# Altium footprint library PCB_CONNECTORS.PcbLib: 676 footprints (part 26 of 43)
Each footprint in its own frame and in the unit in brackets; x right, y up, seen from the top. Pads: shape width x height; smd on the part's side, far side on the other; paste and mask are expansions set on the pad; w line width, h text height; cw(c..) or ccw(c..) is an arc to the next point about the centre after c.
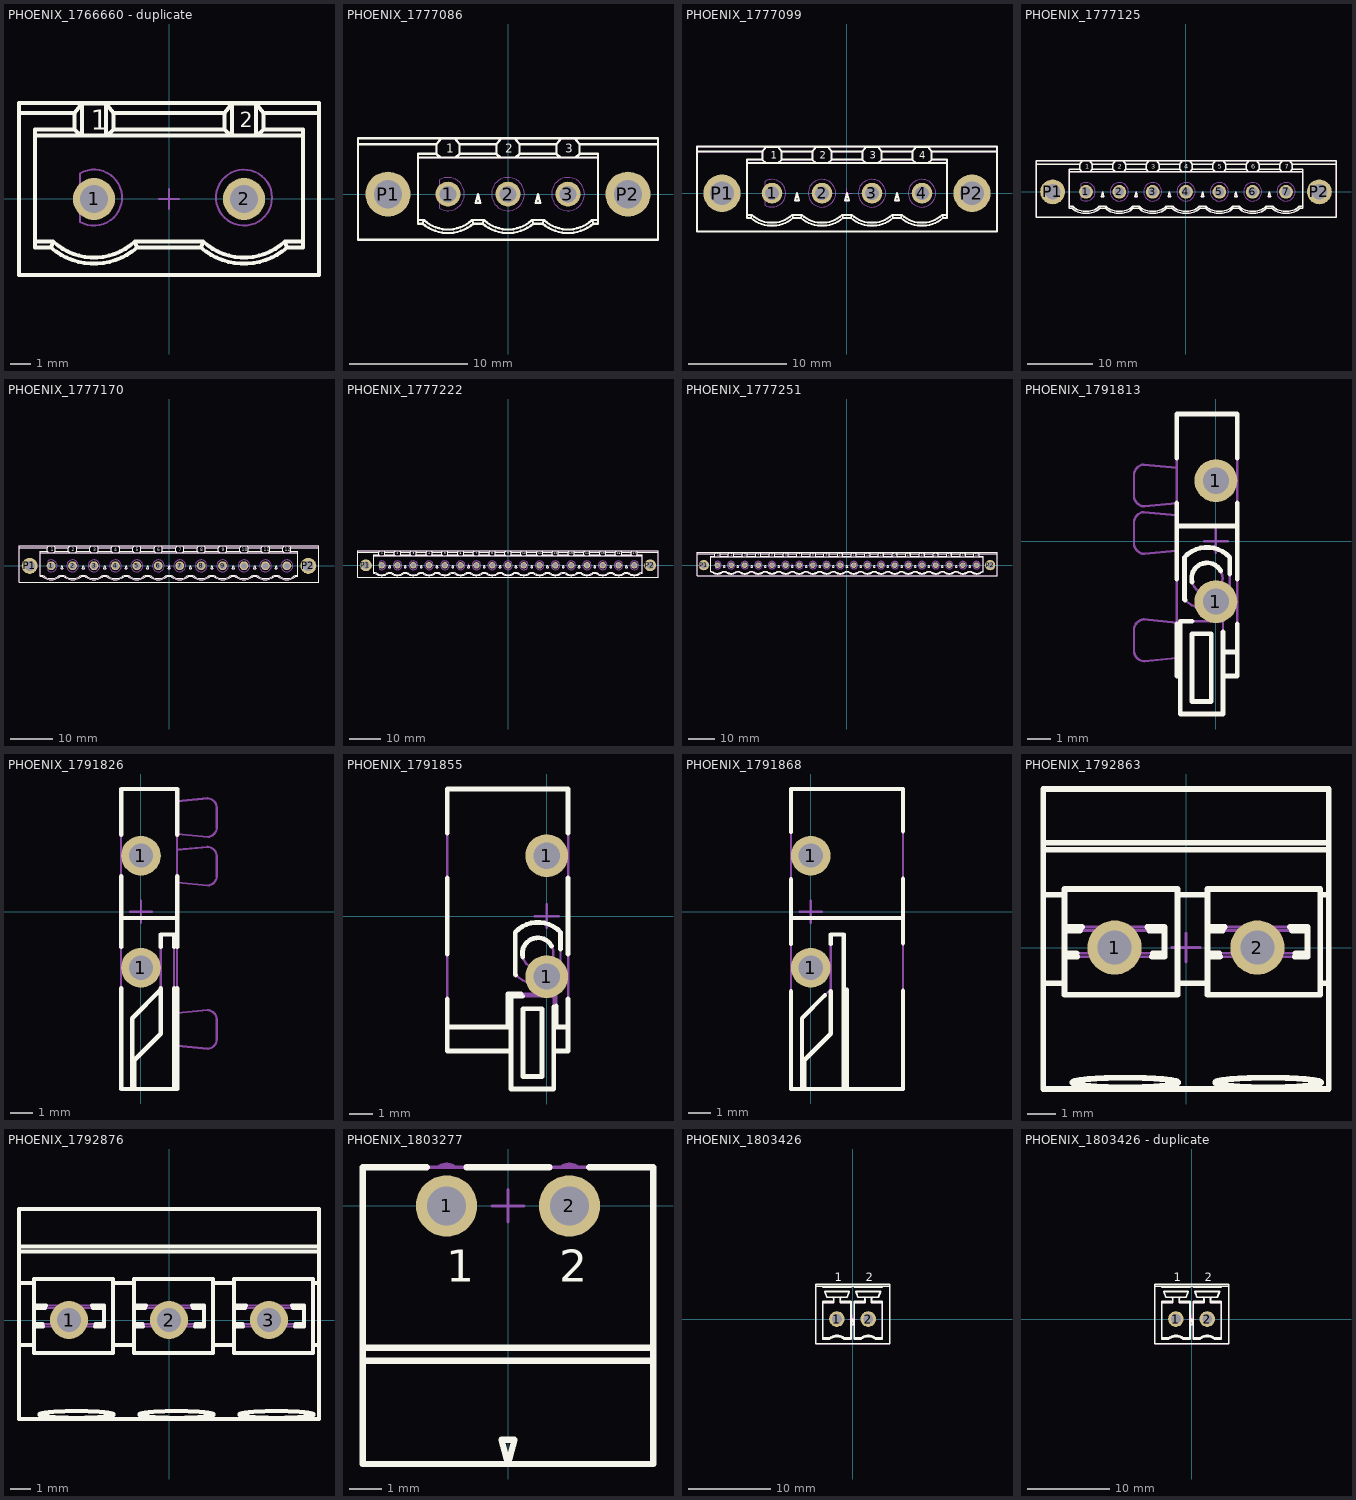
[diagram p25: the footprints below, top view; thin cyan lines are the x and y axes]

## PHOENIX_1766660 - duplicate [mm] "PCB Header, 12A 400 V, Pitch: 7.5mm, 2 Positions, GMSTBVA Serie"
height 12
pads (2):
  round 2.1 hole 1.4: 1(-3.75,0) 2(3.75,0)
Top Overlay:
  lines w0.2: -7.5,4.3 -4.725,4.3 ; -6.7,-2.13 -5.79,-2.13 ; -6.7,3.163 6.7,3.163 ; -4.394,3.163 -4.725,3.475 ; -4.355,3.163 -4.355,4.773 ; -3.145,3.163 -3.145,4.773 ; -3.106,3.163 -2.775,3.475 ; 3.106,3.163 2.775,3.475 ; 3.145,3.163 3.145,4.773 ; 4.355,3.163 4.355,4.773 ; 4.394,3.163 4.725,3.475 ; 6.7,-2.13 5.79,-2.13 ; 7.5,4.3 4.725,4.3 ; -5.904,-2.43 ccw(c-3.75,0.07) -1.596,-2.43 ; -5.904,-2.43 -6.7,-2.43 -6.7,3.475 -4.725,3.475 ; -5.904,-2.43 -5.79,-2.13 ; -5.79,-2.13 ccw(c-3.75,0.07) -1.71,-2.13 ; -4.725,3.475 -4.725,4.3 ; -4.725,4.3 -4.355,4.773 ; -4.355,4.773 -3.145,4.773 ; -3.145,4.773 -2.775,4.3 ; -2.775,3.475 -2.775,4.3 ; -2.775,3.475 2.775,3.475 ; -2.775,4.3 2.775,4.3 ; -1.71,-2.13 -1.596,-2.43 ; -1.71,-2.13 1.71,-2.13 ; -1.596,-2.43 1.596,-2.43 ; 1.596,-2.43 ccw(c3.75,0.07) 5.904,-2.43 ; 1.596,-2.43 1.71,-2.13 ; 1.71,-2.13 ccw(c3.75,0.07) 5.79,-2.13 ; 2.775,3.475 2.775,4.3 ; 2.775,4.3 3.145,4.773 ; 3.145,4.773 4.355,4.773 ; 4.355,4.773 4.725,4.3 ; 4.725,3.475 6.7,3.475 6.7,-2.43 5.904,-2.43 ; 4.725,3.475 4.725,4.3 ; 5.79,-2.13 5.904,-2.43 ; -7.5,-3.8 7.5,-3.8 7.5,4.8 -7.5,4.8 -7.5,-3.8
  text "2" at 3.53,3.575 h0.75
  text "1" at -3.91,3.46 h1
Mechanical 8:
  lines w0.1: -4.25,0 -3.75,0 ; -3.75,-0.5 -3.75,0 ; -3.75,0.5 -3.75,0 ; -3.25,0 -3.75,0 ; -0.5,0 0,0 ; 0,-0.5 0,0 ; 0,0.5 0,0 ; 0.5,0 0,0 ; 3.25,0 3.75,0 ; 3.75,-0.5 3.75,0 ; 3.75,0.5 3.75,0 ; 4.25,0 3.75,0
Mechanical 14:
  circle w0.1: c3.75,0.07 r1.4
  lines w0.1: -7.5,4.3 -4.725,4.3 ; -6.7,-2.13 -5.79,-2.13 ; -6.7,3.163 6.7,3.163 ; -4.394,3.163 -4.725,3.475 ; -4.355,3.163 -4.355,4.773 ; -3.145,3.163 -3.145,4.773 ; -3.106,3.163 -2.775,3.475 ; 3.106,3.163 2.775,3.475 ; 3.145,3.163 3.145,4.773 ; 4.355,3.163 4.355,4.773 ; 4.394,3.163 4.725,3.475 ; 6.7,-2.13 5.79,-2.13 ; 7.5,4.3 4.725,4.3 ; -5.904,-2.43 ccw(c-3.75,0.07) -1.596,-2.43 ; -5.904,-2.43 -6.7,-2.43 -6.7,3.475 -4.725,3.475 ; -5.904,-2.43 -5.79,-2.13 ; -5.79,-2.13 ccw(c-3.75,0.07) -1.71,-2.13 ; -4.725,3.475 -4.725,4.3 ; -4.725,4.3 -4.355,4.773 ; -4.355,4.773 -3.145,4.773 ; -3.145,4.773 -2.775,4.3 ; -2.775,3.475 -2.775,4.3 ; -2.775,3.475 2.775,3.475 ; -2.775,4.3 2.775,4.3 ; -1.71,-2.13 -1.596,-2.43 ; -1.71,-2.13 1.71,-2.13 ; -1.596,-2.43 1.596,-2.43 ; 1.596,-2.43 ccw(c3.75,0.07) 5.904,-2.43 ; 1.596,-2.43 1.71,-2.13 ; 1.71,-2.13 ccw(c3.75,0.07) 5.79,-2.13 ; 2.775,3.475 2.775,4.3 ; 2.775,4.3 3.145,4.773 ; 3.145,4.773 4.355,4.773 ; 4.355,4.773 4.725,4.3 ; 4.725,3.475 6.7,3.475 6.7,-2.43 5.904,-2.43 ; 4.725,3.475 4.725,4.3 ; 5.79,-2.13 5.904,-2.43 ; -7.5,-3.8 7.5,-3.8 7.5,4.8 -7.5,4.8 -7.5,-3.8 ; -4.45,-1.142 ccw(c-3.75,0.07) -4.45,1.282 -4.45,-1.142
  text "2" at 3.53,3.575 h0.75
  text "1" at -3.91,3.46 h1
3D body "PHOENIX_1766660.stp": height 12, standoff -3.9, extent -7.5,-3.8 7.5,4.8

## PHOENIX_1777086 [mm] "PCB Header, 12A, 320V, Pitch: 5.08mm, 3 Positions, MSTBV Serie"
height 12
pads (5):
  round 2.1 hole 1.4: 1(-5.08,0) 2(0,0) 3(5.08,0)
  round 3.8 hole 2.4: P1(-10.16,0) P2(10.16,0)
Top Overlay:
  lines w0.2: -12.7,4.23 -6.055,4.23 ; -7.62,-2.2 -7.12,-2.2 ; -7.62,3.093 7.62,3.093 ; -5.724,3.093 -6.055,3.405 ; -4.436,3.093 -4.105,3.405 ; -0.644,3.093 -0.975,3.405 ; 0.644,3.093 0.975,3.405 ; 4.436,3.093 4.105,3.405 ; 5.724,3.093 6.055,3.405 ; 7.62,-2.2 7.12,-2.2 ; 12.7,4.23 6.055,4.23 ; -7.234,-2.5 ccw(c-5.08,0) -2.926,-2.5 ; -7.234,-2.5 -7.12,-2.2 ; -7.234,-2.5 -7.62,-2.5 -7.62,3.405 -6.055,3.405 ; -7.12,-2.2 ccw(c-5.08,0) -3.04,-2.2 ; -6.055,3.405 -6.055,4.23 ; -6.055,4.23 -5.685,4.703 -4.475,4.703 -4.105,4.23 ; -4.105,3.405 -4.105,4.23 ; -4.105,3.405 -0.975,3.405 ; -4.105,4.23 -0.975,4.23 ; -3.04,-2.2 -2.04,-2.2 ; -3.04,-2.2 -2.926,-2.5 ; -2.926,-2.5 -2.154,-2.5 ; -2.154,-2.5 ccw(c0,0) 2.154,-2.5 ; -2.154,-2.5 -2.04,-2.2 ; -2.04,-2.2 ccw(c0,0) 2.04,-2.2 ; -0.975,3.405 -0.975,4.23 ; -0.975,4.23 -0.605,4.703 0.605,4.703 0.975,4.23 ; 0.975,3.405 0.975,4.23 ; 0.975,3.405 4.105,3.405 ; 0.975,4.23 4.105,4.23 ; 2.04,-2.2 3.04,-2.2 ; 2.04,-2.2 2.154,-2.5 ; 2.154,-2.5 2.926,-2.5 ; 2.926,-2.5 ccw(c5.08,0) 7.234,-2.5 ; 2.926,-2.5 3.04,-2.2 ; 3.04,-2.2 ccw(c5.08,0) 7.12,-2.2 ; 4.105,3.405 4.105,4.23 ; 4.105,4.23 4.475,4.703 5.685,4.703 6.055,4.23 ; 6.055,3.405 6.055,4.23 ; 6.055,3.405 7.62,3.405 7.62,-2.5 7.234,-2.5 ; 7.12,-2.2 7.234,-2.5 ; -12.7,-3.87 12.7,-3.87 12.7,4.73 -12.7,4.73 -12.7,-3.87 ; -2.741,-0.75 -2.339,-0.75 -2.54,0 -2.741,-0.75 ; 2.339,-0.75 2.741,-0.75 2.54,0 2.339,-0.75
  text "3" at 4.851,3.505 h0.75
  text "2" at -0.22,3.505 h0.75
  text "1" at -5.22,3.505 h0.75
Mechanical 8:
  lines w0.1: -10.66,0 -10.16,0 ; -10.16,-0.5 -10.16,0 ; -10.16,0.5 -10.16,0 ; -9.66,0 -10.16,0 ; -5.58,0 -5.08,0 ; -5.08,-0.5 -5.08,0 ; -5.08,0.5 -5.08,0 ; -4.58,0 -5.08,0 ; -0.5,0 0,0 ; 0,-0.5 0,0 ; 0,0.5 0,0 ; 0.5,0 0,0 ; 4.58,0 5.08,0 ; 5.08,-0.5 5.08,0 ; 5.08,0.5 5.08,0 ; 5.58,0 5.08,0 ; 9.66,0 10.16,0 ; 10.16,-0.5 10.16,0 ; 10.16,0.5 10.16,0 ; 10.66,0 10.16,0
Mechanical 14:
  circle w0.1: c5.08,0 r1.4
  circle w0.1: c0,0 r1.4
  circle w0.1: c-10.16,0 r1.25
  circle w0.1: c10.16,0 r1.25
  lines w0.1: -12.7,4.23 -6.055,4.23 ; -7.62,-2.2 -7.12,-2.2 ; -7.62,3.093 7.62,3.093 ; -5.724,3.093 -6.055,3.405 ; -4.436,3.093 -4.105,3.405 ; -0.644,3.093 -0.975,3.405 ; 0.644,3.093 0.975,3.405 ; 4.436,3.093 4.105,3.405 ; 5.724,3.093 6.055,3.405 ; 7.62,-2.2 7.12,-2.2 ; 12.7,4.23 6.055,4.23 ; -7.234,-2.5 ccw(c-5.08,0) -2.926,-2.5 ; -7.234,-2.5 -7.12,-2.2 ; -7.234,-2.5 -7.62,-2.5 -7.62,3.405 -6.055,3.405 ; -7.12,-2.2 ccw(c-5.08,0) -3.04,-2.2 ; -6.055,3.405 -6.055,4.23 ; -6.055,4.23 -5.685,4.703 -4.475,4.703 -4.105,4.23 ; -5.58,-0.5 -4.58,-0.5 ; -5.58,-0.5 -5.58,0.5 ; -5.58,-0.5 -5.312,-0.232 ; -5.58,0.5 -4.58,0.5 ; -5.58,0.5 -5.312,0.232 ; -5.312,-0.232 -4.848,-0.232 ; -5.312,-0.232 -5.312,0.232 ; -5.312,0.232 -4.848,0.232 ; -4.848,-0.232 -4.848,0.232 ; -4.848,-0.232 -4.58,-0.5 ; -4.848,0.232 -4.58,0.5 ; -4.58,-0.5 -4.58,0.5 ; -4.105,3.405 -4.105,4.23 ; -4.105,3.405 -0.975,3.405 ; -4.105,4.23 -0.975,4.23 ; -3.04,-2.2 -2.04,-2.2 ; -3.04,-2.2 -2.926,-2.5 ; -2.926,-2.5 -2.154,-2.5 ; -2.154,-2.5 ccw(c0,0) 2.154,-2.5 ; -2.154,-2.5 -2.04,-2.2 ; -2.04,-2.2 ccw(c0,0) 2.04,-2.2 ; -0.975,3.405 -0.975,4.23 ; -0.975,4.23 -0.605,4.703 0.605,4.703 0.975,4.23 ; -0.5,-0.5 -0.5,0.5 ; -0.5,-0.5 0.5,-0.5 ; -0.5,-0.5 -0.232,-0.232 ; -0.5,0.5 0.5,0.5 ; -0.5,0.5 -0.232,0.232 ; -0.232,-0.232 0.232,-0.232 ; -0.232,-0.232 -0.232,0.232 ; -0.232,0.232 0.232,0.232 ; 0.232,-0.232 0.232,0.232 ; 0.232,-0.232 0.5,-0.5 ; 0.232,0.232 0.5,0.5 ; 0.5,-0.5 0.5,0.5 ; 0.975,3.405 0.975,4.23 ; 0.975,3.405 4.105,3.405 ; 0.975,4.23 4.105,4.23 ; 2.04,-2.2 3.04,-2.2 ; 2.04,-2.2 2.154,-2.5 ; 2.154,-2.5 2.926,-2.5 ; 2.926,-2.5 ccw(c5.08,0) 7.234,-2.5 ; 2.926,-2.5 3.04,-2.2 ; 3.04,-2.2 ccw(c5.08,0) 7.12,-2.2 ; 4.105,3.405 4.105,4.23 ; 4.105,4.23 4.475,4.703 5.685,4.703 6.055,4.23 ; 4.58,-0.5 4.58,0.5 ; 4.58,-0.5 5.58,-0.5 ; 4.58,-0.5 4.848,-0.232 ; 4.58,0.5 5.58,0.5 ; 4.58,0.5 4.848,0.232 ; 4.848,-0.232 5.312,-0.232 ; 4.848,-0.232 4.848,0.232 ; 4.848,0.232 5.312,0.232 ; 5.312,-0.232 5.312,0.232 ; 5.312,-0.232 5.58,-0.5 ; 5.312,0.232 5.58,0.5 ; 5.58,-0.5 5.58,0.5 ; 6.055,3.405 6.055,4.23 ; 6.055,3.405 7.62,3.405 7.62,-2.5 7.234,-2.5 ; 7.12,-2.2 7.234,-2.5 ; -12.7,-3.87 12.7,-3.87 12.7,4.73 -12.7,4.73 -12.7,-3.87 ; -5.78,-1.212 ccw(c-5.08,0) -5.78,1.212 -5.78,-1.212 ; -2.741,-0.75 -2.339,-0.75 -2.54,0 -2.741,-0.75 ; 2.339,-0.75 2.741,-0.75 2.54,0 2.339,-0.75
  text "1" at -5.22,3.505 h0.75
  text "2" at -0.22,3.505 h0.75
  text "3" at 4.851,3.505 h0.75
3D body "PHOENIX_1777086.stp": height 12, standoff -3.9, extent -12.7,-3.8 12.7,4.8

## PHOENIX_1777099 [mm] "PCB Header, 12A, 320V, Pitch: 5.08mm, 4 Positions, MSTBV Serie"
height 12
pads (6):
  round 2.1 hole 1.4: 1(-7.62,0) 2(-2.54,0) 3(2.54,0) 4(7.62,0)
  round 3.8 hole 2.4: P1(-12.7,0) P2(12.7,0)
Top Overlay:
  lines w0.2: -15.24,4.23 -8.595,4.23 ; -10.16,-2.2 -9.66,-2.2 ; -10.16,3.093 10.16,3.093 ; -8.264,3.093 -8.595,3.405 ; -6.976,3.093 -6.645,3.405 ; -3.184,3.093 -3.515,3.405 ; -1.896,3.093 -1.565,3.405 ; 1.896,3.093 1.565,3.405 ; 3.184,3.093 3.515,3.405 ; 6.976,3.093 6.645,3.405 ; 8.264,3.093 8.595,3.405 ; 10.16,-2.2 9.66,-2.2 ; 15.24,4.23 8.595,4.23 ; -9.774,-2.5 ccw(c-7.62,0) -5.466,-2.5 ; -9.774,-2.5 -10.16,-2.5 -10.16,3.405 -8.595,3.405 ; -9.774,-2.5 -9.66,-2.2 ; -9.66,-2.2 ccw(c-7.62,0) -5.58,-2.2 ; -8.595,3.405 -8.595,4.23 ; -8.595,4.23 -8.225,4.703 -7.015,4.703 -6.645,4.23 ; -6.645,3.405 -3.515,3.405 ; -6.645,3.405 -6.645,4.23 ; -6.645,4.23 -3.515,4.23 ; -5.58,-2.2 -5.466,-2.5 ; -5.58,-2.2 -4.58,-2.2 ; -5.466,-2.5 -4.694,-2.5 ; -4.694,-2.5 ccw(c-2.54,0) -0.386,-2.5 ; -4.694,-2.5 -4.58,-2.2 ; -4.58,-2.2 ccw(c-2.54,0) -0.5,-2.2 ; -3.515,3.405 -3.515,4.23 ; -3.515,4.23 -3.145,4.703 -1.935,4.703 -1.565,4.23 ; -1.565,3.405 1.565,3.405 ; -1.565,3.405 -1.565,4.23 ; -1.565,4.23 1.565,4.23 ; -0.5,-2.2 -0.386,-2.5 ; -0.5,-2.2 0.5,-2.2 ; -0.386,-2.5 0.386,-2.5 ; 0.386,-2.5 ccw(c2.54,0) 4.694,-2.5 ; 0.386,-2.5 0.5,-2.2 ; 0.5,-2.2 ccw(c2.54,0) 4.58,-2.2 ; 1.565,3.405 1.565,4.23 ; 1.565,4.23 1.935,4.703 3.145,4.703 3.515,4.23 ; 3.515,3.405 6.645,3.405 ; 3.515,3.405 3.515,4.23 ; 3.515,4.23 6.645,4.23 ; 4.58,-2.2 4.694,-2.5 ; 4.58,-2.2 5.58,-2.2 ; 4.694,-2.5 5.466,-2.5 ; 5.466,-2.5 ccw(c7.62,0) 9.774,-2.5 ; 5.466,-2.5 5.58,-2.2 ; 5.58,-2.2 ccw(c7.62,0) 9.66,-2.2 ; 6.645,3.405 6.645,4.23 ; 6.645,4.23 7.015,4.703 8.225,4.703 8.595,4.23 ; 8.595,3.405 10.16,3.405 10.16,-2.5 9.774,-2.5 ; 8.595,3.405 8.595,4.23 ; 9.66,-2.2 9.774,-2.5 ; -15.24,-3.87 -15.24,4.73 15.24,4.73 15.24,-3.87 -15.24,-3.87 ; -5.281,-0.75 -5.08,0 -4.879,-0.75 -5.281,-0.75 ; -0.201,-0.75 0,0 0.201,-0.75 -0.201,-0.75 ; 4.879,-0.75 5.08,0 5.281,-0.75 4.879,-0.75
  text "4" at 7.366,3.505 h0.75
  text "3" at 2.311,3.505 h0.75
  text "2" at -2.76,3.505 h0.75
  text "1" at -7.76,3.505 h0.75
Mechanical 8:
  lines w0.1: -13.2,0 -12.7,0 ; -12.7,-0.5 -12.7,0 ; -12.7,0.5 -12.7,0 ; -12.2,0 -12.7,0 ; -8.12,0 -7.62,0 ; -7.62,-0.5 -7.62,0 ; -7.62,0.5 -7.62,0 ; -7.12,0 -7.62,0 ; -3.04,0 -2.54,0 ; -2.54,-0.5 -2.54,0 ; -2.54,0.5 -2.54,0 ; -2.04,0 -2.54,0 ; -0.5,0 0,0 ; 0,-0.5 0,0 ; 0,0.5 0,0 ; 0.5,0 0,0 ; 2.04,0 2.54,0 ; 2.54,-0.5 2.54,0 ; 2.54,0.5 2.54,0 ; 3.04,0 2.54,0 ; 7.12,0 7.62,0 ; 7.62,-0.5 7.62,0 ; 7.62,0.5 7.62,0 ; 8.12,0 7.62,0 ; 12.2,0 12.7,0 ; 12.7,-0.5 12.7,0 ; 12.7,0.5 12.7,0 ; 13.2,0 12.7,0
Mechanical 14:
  circle w0.1: c2.54,0 r1.4
  circle w0.1: c12.7,0 r1.25
  circle w0.1: c-12.7,0 r1.25
  circle w0.1: c-2.54,0 r1.4
  circle w0.1: c7.62,0 r1.4
  lines w0.1: -15.24,4.23 -8.595,4.23 ; -10.16,-2.2 -9.66,-2.2 ; -10.16,3.093 10.16,3.093 ; -8.264,3.093 -8.595,3.405 ; -6.976,3.093 -6.645,3.405 ; -3.184,3.093 -3.515,3.405 ; -1.896,3.093 -1.565,3.405 ; 1.896,3.093 1.565,3.405 ; 3.184,3.093 3.515,3.405 ; 6.976,3.093 6.645,3.405 ; 8.264,3.093 8.595,3.405 ; 10.16,-2.2 9.66,-2.2 ; 15.24,4.23 8.595,4.23 ; -9.774,-2.5 ccw(c-7.62,0) -5.466,-2.5 ; -9.774,-2.5 -10.16,-2.5 -10.16,3.405 -8.595,3.405 ; -9.774,-2.5 -9.66,-2.2 ; -9.66,-2.2 ccw(c-7.62,0) -5.58,-2.2 ; -8.595,3.405 -8.595,4.23 ; -8.595,4.23 -8.225,4.703 -7.015,4.703 -6.645,4.23 ; -8.12,-0.5 -7.852,-0.232 ; -8.12,-0.5 -8.12,0.5 ; -8.12,-0.5 -7.12,-0.5 ; -8.12,0.5 -7.852,0.232 ; -8.12,0.5 -7.12,0.5 ; -7.852,-0.232 -7.852,0.232 ; -7.852,-0.232 -7.388,-0.232 ; -7.852,0.232 -7.388,0.232 ; -7.388,-0.232 -7.12,-0.5 ; -7.388,-0.232 -7.388,0.232 ; -7.388,0.232 -7.12,0.5 ; -7.12,-0.5 -7.12,0.5 ; -6.645,3.405 -3.515,3.405 ; -6.645,3.405 -6.645,4.23 ; -6.645,4.23 -3.515,4.23 ; -5.58,-2.2 -5.466,-2.5 ; -5.58,-2.2 -4.58,-2.2 ; -5.466,-2.5 -4.694,-2.5 ; -4.694,-2.5 ccw(c-2.54,0) -0.386,-2.5 ; -4.694,-2.5 -4.58,-2.2 ; -4.58,-2.2 ccw(c-2.54,0) -0.5,-2.2 ; -3.515,3.405 -3.515,4.23 ; -3.515,4.23 -3.145,4.703 -1.935,4.703 -1.565,4.23 ; -3.04,-0.5 -2.772,-0.232 ; -3.04,-0.5 -2.04,-0.5 ; -3.04,-0.5 -3.04,0.5 ; -3.04,0.5 -2.772,0.232 ; -3.04,0.5 -2.04,0.5 ; -2.772,-0.232 -2.772,0.232 ; -2.772,-0.232 -2.308,-0.232 ; -2.772,0.232 -2.308,0.232 ; -2.308,-0.232 -2.04,-0.5 ; -2.308,-0.232 -2.308,0.232 ; -2.308,0.232 -2.04,0.5 ; -2.04,-0.5 -2.04,0.5 ; -1.565,3.405 1.565,3.405 ; -1.565,3.405 -1.565,4.23 ; -1.565,4.23 1.565,4.23 ; -0.5,-2.2 -0.386,-2.5 ; -0.5,-2.2 0.5,-2.2 ; -0.386,-2.5 0.386,-2.5 ; 0.386,-2.5 ccw(c2.54,0) 4.694,-2.5 ; 0.386,-2.5 0.5,-2.2 ; 0.5,-2.2 ccw(c2.54,0) 4.58,-2.2 ; 1.565,3.405 1.565,4.23 ; 1.565,4.23 1.935,4.703 3.145,4.703 3.515,4.23 ; 2.04,-0.5 2.308,-0.232 ; 2.04,-0.5 3.04,-0.5 ; 2.04,-0.5 2.04,0.5 ; 2.04,0.5 2.308,0.232 ; 2.04,0.5 3.04,0.5 ; 2.308,-0.232 2.308,0.232 ; 2.308,-0.232 2.772,-0.232 ; 2.308,0.232 2.772,0.232 ; 2.772,-0.232 3.04,-0.5 ; 2.772,-0.232 2.772,0.232 ; 2.772,0.232 3.04,0.5 ; 3.04,-0.5 3.04,0.5 ; 3.515,3.405 6.645,3.405 ; 3.515,3.405 3.515,4.23 ; 3.515,4.23 6.645,4.23 ; 4.58,-2.2 4.694,-2.5 ; 4.58,-2.2 5.58,-2.2 ; 4.694,-2.5 5.466,-2.5 ; 5.466,-2.5 ccw(c7.62,0) 9.774,-2.5 ; 5.466,-2.5 5.58,-2.2 ; 5.58,-2.2 ccw(c7.62,0) 9.66,-2.2 ; 6.645,3.405 6.645,4.23 ; 6.645,4.23 7.015,4.703 8.225,4.703 8.595,4.23 ; 7.12,-0.5 7.388,-0.232 ; 7.12,-0.5 8.12,-0.5 ; 7.12,-0.5 7.12,0.5 ; 7.12,0.5 7.388,0.232 ; 7.12,0.5 8.12,0.5 ; 7.388,-0.232 7.388,0.232 ; 7.388,-0.232 7.852,-0.232 ; 7.388,0.232 7.852,0.232 ; 7.852,-0.232 8.12,-0.5 ; 7.852,-0.232 7.852,0.232 ; 7.852,0.232 8.12,0.5 ; 8.12,-0.5 8.12,0.5 ; 8.595,3.405 10.16,3.405 10.16,-2.5 9.774,-2.5 ; 8.595,3.405 8.595,4.23 ; 9.66,-2.2 9.774,-2.5 ; -15.24,-3.87 -15.24,4.73 15.24,4.73 15.24,-3.87 -15.24,-3.87 ; -8.32,-1.212 ccw(c-7.62,0) -8.32,1.212 -8.32,-1.212 ; -5.281,-0.75 -5.08,0 -4.879,-0.75 -5.281,-0.75 ; -0.201,-0.75 0,0 0.201,-0.75 -0.201,-0.75 ; 4.879,-0.75 5.08,0 5.281,-0.75 4.879,-0.75
  text "1" at -7.76,3.505 h0.75
  text "2" at -2.76,3.505 h0.75
  text "3" at 2.311,3.505 h0.75
  text "4" at 7.366,3.505 h0.75
3D body "PHOENIX_1777099.stp": height 12, standoff -3.9, extent -15.24,-3.8 15.24,4.8

## PHOENIX_1777125 [mm] "PCB Header, 12A, 320V, Pitch: 5.08mm, 7 Positions, MSTBV Serie"
height 12
pads (9):
  round 2.1 hole 1.4: 1(-15.24,0) 2(-10.16,0) 3(-5.08,0) 4(0,0) 5(5.08,0) 6(10.16,0) 7(15.24,0)
  round 3.8 hole 2.4: P1(-20.32,0) P2(20.32,0)
Top Overlay:
  lines w0.2: -22.86,4.23 -16.215,4.23 ; -17.78,-2.2 -17.28,-2.2 ; -17.78,3.093 17.78,3.093 ; -15.884,3.093 -16.215,3.405 ; -14.596,3.093 -14.265,3.405 ; -10.804,3.093 -11.135,3.405 ; -9.516,3.093 -9.185,3.405 ; -5.724,3.093 -6.055,3.405 ; -4.436,3.093 -4.105,3.405 ; -0.644,3.093 -0.975,3.405 ; 0.644,3.093 0.975,3.405 ; 4.436,3.093 4.105,3.405 ; 5.724,3.093 6.055,3.405 ; 9.516,3.093 9.185,3.405 ; 10.804,3.093 11.135,3.405 ; 14.596,3.093 14.265,3.405 ; 15.884,3.093 16.215,3.405 ; 17.78,-2.2 17.28,-2.2 ; 22.86,4.23 16.215,4.23 ; -17.394,-2.5 ccw(c-15.24,0) -13.086,-2.5 ; -17.394,-2.5 -17.28,-2.2 ; -17.394,-2.5 -17.78,-2.5 -17.78,3.405 -16.215,3.405 ; -17.28,-2.2 ccw(c-15.24,0) -13.2,-2.2 ; -16.215,3.405 -16.215,4.23 ; -16.215,4.23 -15.845,4.703 -14.635,4.703 -14.265,4.23 ; -14.265,3.405 -14.265,4.23 ; -14.265,3.405 -11.135,3.405 ; -14.265,4.23 -11.135,4.23 ; -13.2,-2.2 -12.2,-2.2 ; -13.2,-2.2 -13.086,-2.5 ; -13.086,-2.5 -12.314,-2.5 ; -12.314,-2.5 ccw(c-10.16,0) -8.006,-2.5 ; -12.314,-2.5 -12.2,-2.2 ; -12.2,-2.2 ccw(c-10.16,0) -8.12,-2.2 ; -11.135,3.405 -11.135,4.23 ; -11.135,4.23 -10.765,4.703 -9.555,4.703 -9.185,4.23 ; -9.185,3.405 -9.185,4.23 ; -9.185,3.405 -6.055,3.405 ; -9.185,4.23 -6.055,4.23 ; -8.12,-2.2 -8.006,-2.5 ; -8.12,-2.2 -7.12,-2.2 ; -8.006,-2.5 -7.234,-2.5 ; -7.234,-2.5 ccw(c-5.08,0) -2.926,-2.5 ; -7.234,-2.5 -7.12,-2.2 ; -7.12,-2.2 ccw(c-5.08,0) -3.04,-2.2 ; -6.055,3.405 -6.055,4.23 ; -6.055,4.23 -5.685,4.703 -4.475,4.703 -4.105,4.23 ; -4.105,3.405 -4.105,4.23 ; -4.105,3.405 -0.975,3.405 ; -4.105,4.23 -0.975,4.23 ; -3.04,-2.2 -2.926,-2.5 ; -3.04,-2.2 -2.04,-2.2 ; -2.926,-2.5 -2.154,-2.5 ; -2.154,-2.5 ccw(c0,0) 2.154,-2.5 ; -2.154,-2.5 -2.04,-2.2 ; -2.04,-2.2 ccw(c0,0) 2.04,-2.2 ; -0.975,3.405 -0.975,4.23 ; -0.975,4.23 -0.605,4.703 0.605,4.703 0.975,4.23 ; 0.975,3.405 0.975,4.23 ; 0.975,3.405 4.105,3.405 ; 0.975,4.23 4.105,4.23 ; 2.04,-2.2 2.154,-2.5 ; 2.04,-2.2 3.04,-2.2 ; 2.154,-2.5 2.926,-2.5 ; 2.926,-2.5 ccw(c5.08,0) 7.234,-2.5 ; 2.926,-2.5 3.04,-2.2 ; 3.04,-2.2 ccw(c5.08,0) 7.12,-2.2 ; 4.105,3.405 4.105,4.23 ; 4.105,4.23 4.475,4.703 5.685,4.703 6.055,4.23 ; 6.055,3.405 9.185,3.405 ; 6.055,3.405 6.055,4.23 ; 6.055,4.23 9.185,4.23 ; 7.12,-2.2 8.12,-2.2 ; 7.12,-2.2 7.234,-2.5 ; 7.234,-2.5 8.006,-2.5 ; 8.006,-2.5 ccw(c10.16,0) 12.314,-2.5 ; 8.006,-2.5 8.12,-2.2 ; 8.12,-2.2 ccw(c10.16,0) 12.2,-2.2 ; 9.185,3.405 9.185,4.23 ; 9.185,4.23 9.555,4.703 10.765,4.703 11.135,4.23 ; 11.135,3.405 11.135,4.23 ; 11.135,3.405 14.265,3.405 ; 11.135,4.23 14.265,4.23 ; 12.2,-2.2 13.2,-2.2 ; 12.2,-2.2 12.314,-2.5 ; 12.314,-2.5 13.086,-2.5 ; 13.086,-2.5 ccw(c15.24,0) 17.394,-2.5 ; 13.086,-2.5 13.2,-2.2 ; 13.2,-2.2 ccw(c15.24,0) 17.28,-2.2 ; 14.265,3.405 14.265,4.23 ; 14.265,4.23 14.635,4.703 15.845,4.703 16.215,4.23 ; 16.215,3.405 16.215,4.23 ; 16.215,3.405 17.78,3.405 17.78,-2.5 17.394,-2.5 ; 17.28,-2.2 17.394,-2.5 ; -22.86,-3.87 22.86,-3.87 22.86,4.73 -22.86,4.73 -22.86,-3.87 ; -12.901,-0.75 -12.499,-0.75 -12.7,0 -12.901,-0.75 ; -7.821,-0.75 -7.419,-0.75 -7.62,0 -7.821,-0.75 ; -2.741,-0.75 -2.339,-0.75 -2.54,0 -2.741,-0.75 ; 2.339,-0.75 2.741,-0.75 2.54,0 2.339,-0.75 ; 7.419,-0.75 7.821,-0.75 7.62,0 7.419,-0.75 ; 12.499,-0.75 12.901,-0.75 12.7,0 12.499,-0.75
  text "7" at 15.037,3.505 h0.75
  text "6" at 9.957,3.505 h0.75
  text "1" at -15.38,3.505 h0.75
  text "2" at -10.38,3.505 h0.75
  text "3" at -5.309,3.505 h0.75
  text "4" at -0.254,3.505 h0.75
  text "5" at 4.877,3.505 h0.75
Mechanical 8:
  lines w0.1: -20.82,0 -20.32,0 ; -20.32,-0.5 -20.32,0 ; -20.32,0.5 -20.32,0 ; -19.82,0 -20.32,0 ; -15.74,0 -15.24,0 ; -15.24,-0.5 -15.24,0 ; -15.24,0.5 -15.24,0 ; -14.74,0 -15.24,0 ; -10.66,0 -10.16,0 ; -10.16,-0.5 -10.16,0 ; -10.16,0.5 -10.16,0 ; -9.66,0 -10.16,0 ; -5.58,0 -5.08,0 ; -5.08,-0.5 -5.08,0 ; -5.08,0.5 -5.08,0 ; -4.58,0 -5.08,0 ; -0.5,0 0,0 ; 0,-0.5 0,0 ; 0,0.5 0,0 ; 0.5,0 0,0 ; 4.58,0 5.08,0 ; 5.08,-0.5 5.08,0 ; 5.08,0.5 5.08,0 ; 5.58,0 5.08,0 ; 9.66,0 10.16,0 ; 10.16,-0.5 10.16,0 ; 10.16,0.5 10.16,0 ; 10.66,0 10.16,0 ; 14.74,0 15.24,0 ; 15.24,-0.5 15.24,0 ; 15.24,0.5 15.24,0 ; 15.74,0 15.24,0 ; 19.82,0 20.32,0 ; 20.32,-0.5 20.32,0 ; 20.32,0.5 20.32,0 ; 20.82,0 20.32,0
Mechanical 14:
  drawing of 228 lines, arcs and shapes, not listed
  text "5" at 4.877,3.505 h0.75
  text "4" at -0.254,3.505 h0.75
  text "3" at -5.309,3.505 h0.75
  text "2" at -10.38,3.505 h0.75
  text "1" at -15.38,3.505 h0.75
  text "6" at 9.957,3.505 h0.75
  text "7" at 15.037,3.505 h0.75
3D body "PHOENIX_1777125.stp": height 12, standoff -3.9, extent -22.86,-3.8 22.86,4.8
